# Altium footprint library CM3Board.PcbLib: 127 footprints (part 7 of 8)
Each footprint in its own frame and in the unit in brackets; x right, y up, seen from the top. Pads: shape width x height; smd on the part's side, far side on the other; paste and mask are expansions set on the pad; w line width, h text height; cw(c..) or ccw(c..) is an arc to the next point about the centre after c.
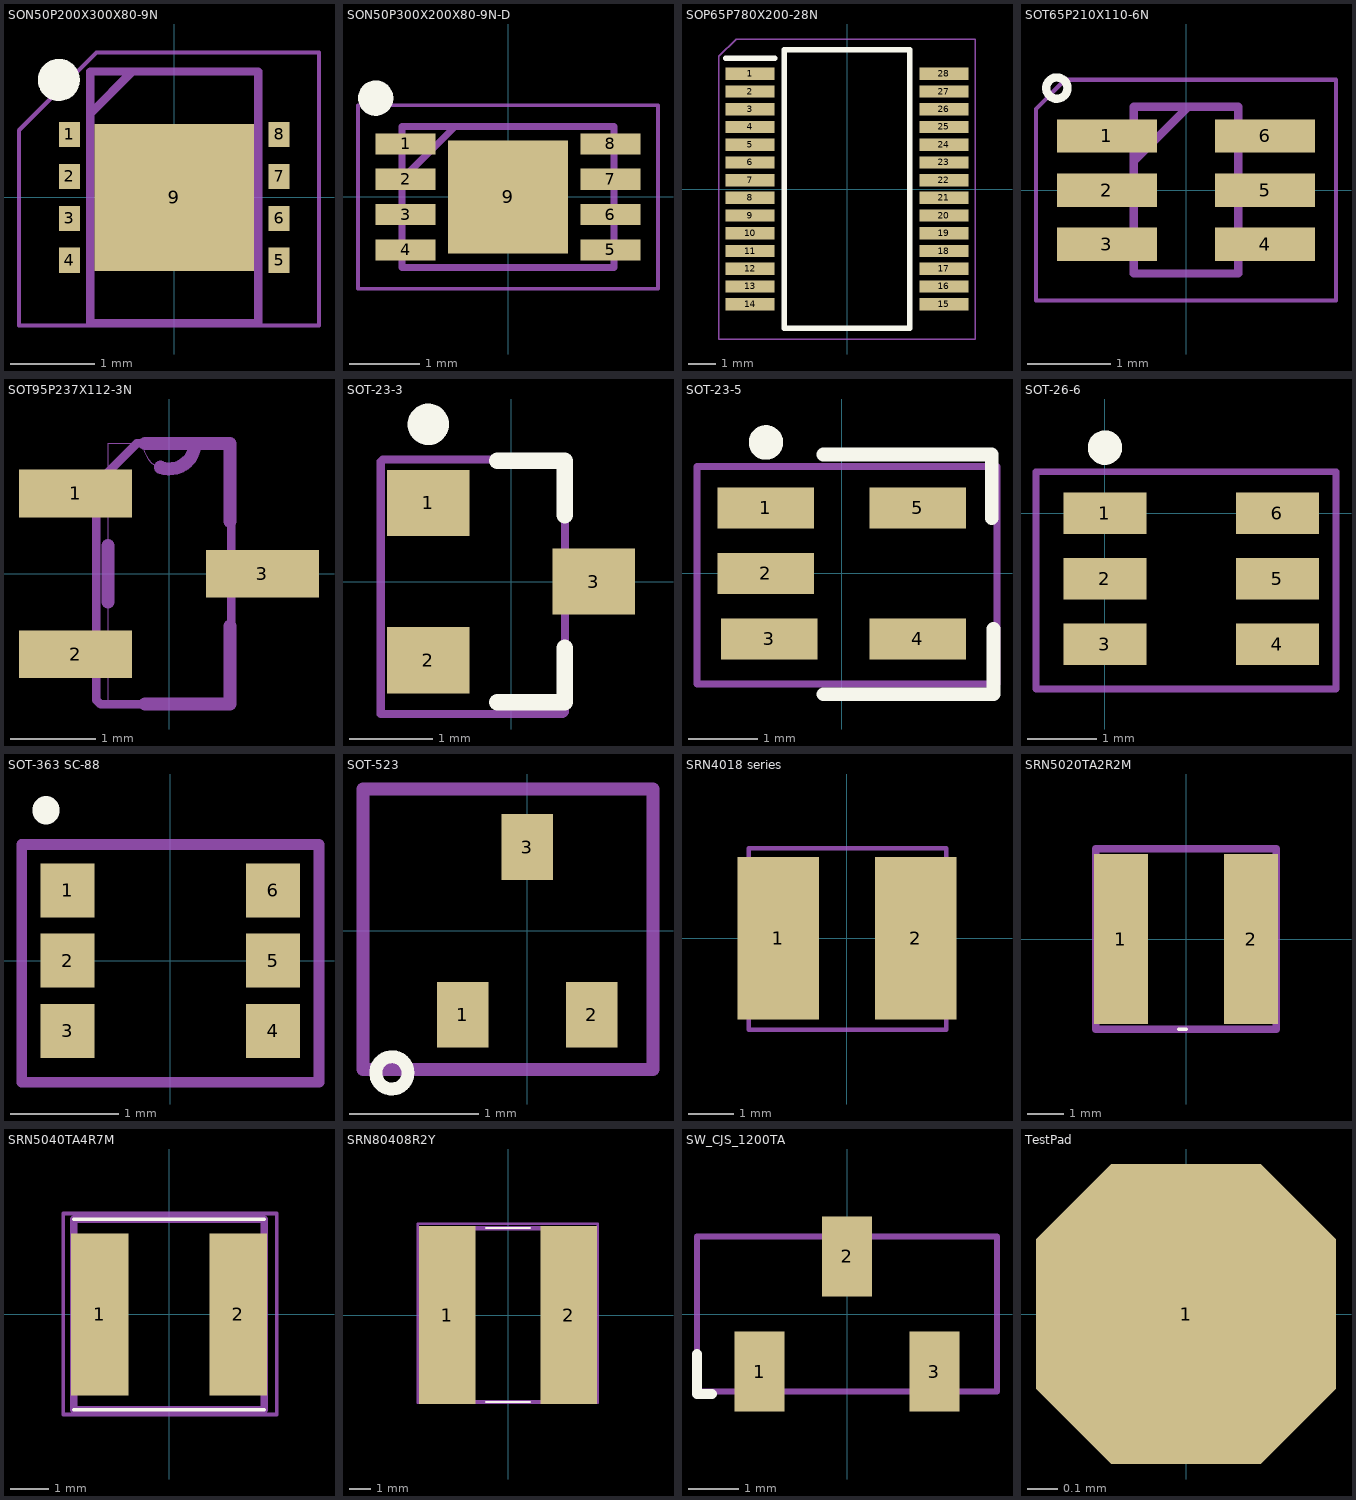
[diagram p6: the footprints below, top view; thin cyan lines are the x and y axes]

## SON50P200X300X80-9N [mm]
pads (9):
  rect 0.25x0.3 smd: 1(-1.25,0.75) 2(-1.25,0.25) 3(-1.25,-0.25) 4(-1.25,-0.75) 5(1.25,-0.75) 6(1.25,-0.25) 7(1.25,0.25) 8(1.25,0.75)
  rect 1.9x1.75 smd: 9(0,0)
Top Overlay:
  circle w0.25: c-1.375,1.4 r0.125
Mechanical 13:
  lines w0.1: -1,1 -0.5,1.5 ; -1,-1.5 -1,1.5 1,1.5 1,-1.5 -1,-1.5
Mechanical 29:
  lines w0.05: -1.85,-1.525 1.725,-1.525 1.725,1.725 -0.925,1.725 -1.85,0.8 -1.85,-1.525
  text ".Designator" at -0.5,-0.45 h1
3D body "MAX31740ATA+T.stp": height 0.8, standoff 0, extent -1.05,-1.5 1.05,1.5

## SON50P300X200X80-9N-D [mm]
pads (9):
  rect 0.85x0.3 smd: 1(-1.45,0.75) 2(-1.45,0.25) 3(-1.45,-0.25) 4(-1.45,-0.75) 5(1.45,-0.75) 6(1.45,-0.25) 7(1.45,0.25) 8(1.45,0.75)
  rect 1.7x1.6 smd: 9(0,0)
Top Overlay:
  circle w0.25: c-1.875,1.4 r0.125
Mechanical 13:
  lines w0.1: -1.5,0.25 -0.75,1 ; -1.5,-1 -1.5,1 1.5,1 1.5,-1 -1.5,-1
Mechanical 29:
  lines w0.05: -2.125,-1.3 2.125,-1.3 2.125,1.3 -2.125,1.3 -2.125,-1.3
  text ".Designator" at -1.675,-1.25 h1.52
3D body "DIO6605BFN8.stp": height 0.8, standoff 0, extent -1.55,-1 1.55,1

## SOP65P780X200-28N [mm]
pads (28):
  rect 1.8x0.45 smd: 1(-3.55,4.225) 2(-3.55,3.575) 3(-3.55,2.925) 4(-3.55,2.275) 5(-3.55,1.625) 6(-3.55,0.975) 7(-3.55,0.325) 8(-3.55,-0.325) 9(-3.55,-0.975) 10(-3.55,-1.625) 11(-3.55,-2.275) 12(-3.55,-2.925) 13(-3.55,-3.575) 14(-3.55,-4.225) 15(3.55,-4.225) 16(3.55,-3.575) 17(3.55,-2.925) 18(3.55,-2.275) 19(3.55,-1.625) 20(3.55,-0.975) 21(3.55,-0.325) 22(3.55,0.325) 23(3.55,0.975) 24(3.55,1.625) 25(3.55,2.275) 26(3.55,2.925) 27(3.55,3.575) 28(3.55,4.225)
Top Overlay:
  lines w0.2: -4.45,4.8 -2.65,4.8 ; -2.3,-5.1 2.3,-5.1 2.3,5.1 -2.3,5.1 -2.3,-5.1
Mechanical 29:
  lines w0.05: -4.7,-5.5 4.7,-5.5 4.7,5.5 -4.06,5.5 -4.7,4.86 -4.7,-5.5
  text ".Designator" at -1.23,4.13 h1
3D body "PCM2704CDBR.stp": height 2, standoff 0, extent -3.9,-5.1 3.9,5.1

## SOT65P210X110-6N [mm]
pads (6):
  rect 1.2x0.4 smd: 1(-0.95,0.65) 2(-0.95,0) 3(-0.95,-0.65) 4(0.95,-0.65) 5(0.95,0) 6(0.95,0.65)
Top Overlay:
  circle w0.1: c-1.55,1.225 r0.127
Mechanical 13:
  lines w0.1: -0.625,0.35 0.025,1 ; -0.625,-1 0.625,-1 0.625,1 -0.625,1 -0.625,-1
Mechanical 29:
  lines w0.05: -1.8,-1.325 -1.8,0.975 -1.45,1.325 1.8,1.325 1.8,-1.325 -1.8,-1.325
  text ".Designator" at -0.95,-0.625 h1
3D body "TPS22919DCKR.stp": height 1.1, standoff 0, extent -1.05,-1 1.05,1

## SOT95P237X112-3N [mil] "SOT95P237X112-3N"
pads (3):
  rect 52x22 smd: 1(-43,37) 2(-43,-37) 3(43,0)
Mechanical 8:
  lines w0: -28,-47 -28,-60 28,-60 28,-10 ; -28,-47 -28,-28 ; -28,-47 -52,-47 -52,-28 -28,-28 ; -28,-28 -28,28 ; -28,28 -28,47 ; -28,28 -52,28 -52,47 -28,47 ; -28,47 -28,60 -12,60 ; -12,60 ccw(c0,60) 12,60 ; -12,60 12,60 ; 12,60 28,60 28,10 ; 28,-10 28,10 ; 28,-10 52,-10 52,10 28,10
Mechanical 16:
  lines w6: -28,-13 -28,13 ; -11,-60 28,-60 28,-24 ; -11,60 12,60 ; -4,49 ccw(c0.15,60.1) 12,60 ; 28,24 28,60 12,60
Mechanical 29:
  lines w3.94: -33.46,-58.07 -31.5,-60.04 27.56,-60.04 28.54,-59.06 28.54,60.04 -14.76,60.04 -33.46,41.34 -33.46,-58.07
  text ".Designator" at -3.94,43.31 h39.37

## SOT-23-3 [mm] "SOT23, 3-Leads, Body 2.92x1.3mm, Pitch 0.95mm"
height 1.11
pads (3):
  rect 1x0.8 smd: 1(-1,0.95) 2(-1,-0.95) 3(1,0)
Top Overlay:
  circle w0.25: c-1,1.9 r0.125
  lines w0.2: -0.165,-1.46 0.65,-1.46 0.65,-0.8 ; -0.165,1.46 0.65,1.46 0.65,0.8
Mechanical 29:
  lines w0.1: -1.575,-1.6 -1.575,1.45 -1.55,1.475 0.65,1.475 0.65,-1.575 0.625,-1.6 -1.575,-1.6
  text ".Designator" at -0.8,1.125 h1
3D body "SOT23-3.step": height 1.3, standoff 0, extent -1.4,-1.45 1.4,1.45

## SOT-23-5 [mm] "SOT23, 3-Leads, Body 2.92x1.3mm, Pitch 0.95mm"
height 1.11
pads (5):
  rect 1.4x0.6 smd: 1(-1.1,0.95) 2(-1.1,0) 3(-1.05,-0.95) 4(1.1,-0.95) 5(1.1,0.95)
Top Overlay:
  circle w0.25: c-1.1,1.9 r0.125
  lines w0.2: -0.265,-1.75 2.2,-1.75 2.2,-0.8 ; -0.265,1.725 2.175,1.725 2.175,0.8
Mechanical 29:
  lines w0.1: -2.1,-1.6 -2.1,1.55 2.25,1.55 2.25,-1.6 -2.1,-1.6
  text ".Designator" at -0.9,1.125 h1
3D body "SOT-23-5.step": height 1.05, standoff -0.05, extent -1.175,-1.5 1.325,1.5

## SOT-26-6 [mm] "SOT23, 3-Leads, Body 2.92x1.3mm, Pitch 0.95mm"
height 1.11
pads (6):
  rect 1.2x0.6 smd: 1(0,0) 2(0,-0.95) 3(0,-1.9) 4(2.5,-1.9) 5(2.5,-0.95) 6(2.5,0)
Top Overlay:
  circle w0.25: c0,0.95 r0.125
Mechanical 29:
  lines w0.1: -1,-2.55 -1,0.6 3.35,0.6 3.35,-2.55 -1,-2.55
  text ".Designator" at -0.55,-1.49 h1
3D body "User Library-ZXTC2045E6TA.step": height 1.4, standoff 0, extent -0.21,-2.54 2.79,0.56

## SOT-363 SC-88 [mm] "SOT23, 3-Leads, Body 2.92x1.3mm, Pitch 0.95mm"
height 1.11
pads (6):
  rect 0.5x0.5 smd: 1(-0.95,0.65) 2(-0.95,0) 3(-0.95,-0.65) 4(0.95,-0.65) 5(0.95,0) 6(0.95,0.65)
Top Overlay:
  lines w0.25: -1.151,1.384 ccw(c-1.275,1.4) -1.15,1.4
Mechanical 29:
  lines w0.1: -1.375,-1.125 -1.375,1.075 1.375,1.075 1.375,-1.125 -1.375,-1.125
  text ".Designator" at -0.75,0.825 h1
3D body "SC88-6 sot363.step": height 1.1, standoff 0, extent -1.1,-1 1.1,1

## SOT-523 [mm] "SOT23, 3-Leads, Body 2.92x1.3mm, Pitch 0.95mm"
height 1.11
pads (3):
  rect 0.4x0.51 smd: 1(-0.5,-0.65) 2(0.5,-0.65) 3(0,0.65)
Top Overlay:
  circle w0.1: c-1.05,-1.1 r0.125
Mechanical 29:
  lines w0.1: 0.975,1.1 -1.275,1.1 -1.275,-1.075 0.975,-1.075 0.975,1.1 ; 0.975,1.1 0.975,1.1
  text ".Designator" at -1.125,-0.8 h1
3D body "SOT-523.step": height 0.8, standoff 0, extent -0.8,-0.8 0.8,0.8

## SRN4018 series [mm]
pads (2):
  rect 1.8x3.6 smd: 1(-1.525,0) 2(1.525,0)
Mechanical 29:
  lines w0.1: -2.175,-2.025 -2.175,2 2.2,2 2.2,-2.025 -2.175,-2.025
  text ".Designator" at -2.055,-0.3 h1
3D body "srn4018.stp": height 1.8, standoff 0, extent -2.175,-2 2.225,2

## SRN5020TA2R2M [mm]
pads (2):
  rect 1.5x4.7 smd: 1(-1.8,0) 2(1.8,0)
Top Overlay:
  lines w0.1: -0.2,-2.5 0,-2.5
Mechanical 13:
  lines w0.2: -2.5,-2.5 -2.5,2.5 2.5,2.5 2.5,-2.5 -2.5,-2.5
Mechanical 29:
  text ".Designator" at -0.87,-0.5 h1
3D body "SRN5020TA-2R2M.stp": height 2.1, standoff 0, extent -2.5,-2.5 2.5,2.5

## SRN5040TA4R7M [mm]
pads (2):
  rect 1.5x4.2 smd: 1(-1.8,0) 2(1.8,0)
Top Overlay:
  lines w0.1: -2.475,-2.475 2.475,-2.475 ; -2.475,2.475 2.475,2.475
Mechanical 13:
  lines w0.2: -2.475,-2.475 -2.475,2.475 2.475,2.475 2.475,-2.475 -2.475,-2.475
Mechanical 29:
  lines w0.1: -2.75,-2.6 -2.75,2.625 2.8,2.625 2.8,-2.6 -2.75,-2.6
  text ".Designator" at -2.175,-1.5 h1.52
3D body "User Library-SRN5040.step": height 4, standoff 0, extent -2.425,-2.5 2.575,2.5

## SRN80408R2Y [mm]
pads (2):
  rect 2.6x8.2 smd: 1(-2.8,0) 2(2.8,0)
Top Overlay:
  lines w0.1: -1,-4 1,-4 ; -1,4 1,4
Mechanical 13:
  lines w0.2: -4,-4 4,-4 4,4 -4,4 -4,-4
Mechanical 29:
  lines w0.1: -4.15,-4.05 -4.15,4.2 4.125,4.2 4.125,-4.05 -4.15,-4.05
  text ".Designator" at -4.2,-2.225 h1.52
3D body "SRN8040-2R2Y.stp": height 4, standoff 0, extent -3.975,-3.95 4.025,4.05

## SW_CJS_1200TA [mm] "Copal- Electronics"
height 2.5
pads (3):
  rect 1x1.6 smd paste+0 mask+0.05: 1(-1.75,-1.15) 2(0,1.15) 3(1.75,-1.15)
Top Overlay:
  lines w0.2: -3,-0.8 -3,-1.6 -2.7,-1.6
Mechanical 29:
  lines w0.127: -3,-1.55 3,-1.55 3,1.55 -3,1.55 -3,-1.55
  text ".Designator" at -2.25,-0.25 h1.02
3D body: height 2.5, standoff 0, extent -2.999,-1.549 2.999,1.549
3D body: height 2.51, standoff 1, extent -1.5,-0.5 1.5,0.5

## TestPad [mm]
pads (1):
  oct 1x1 smd paste-2: 1(0,0)